# Altium schematic symbol library microbuilder.SCHLIB: 530 symbols (part 4 of 7) (continued)
## LPC1113/4 (continued)
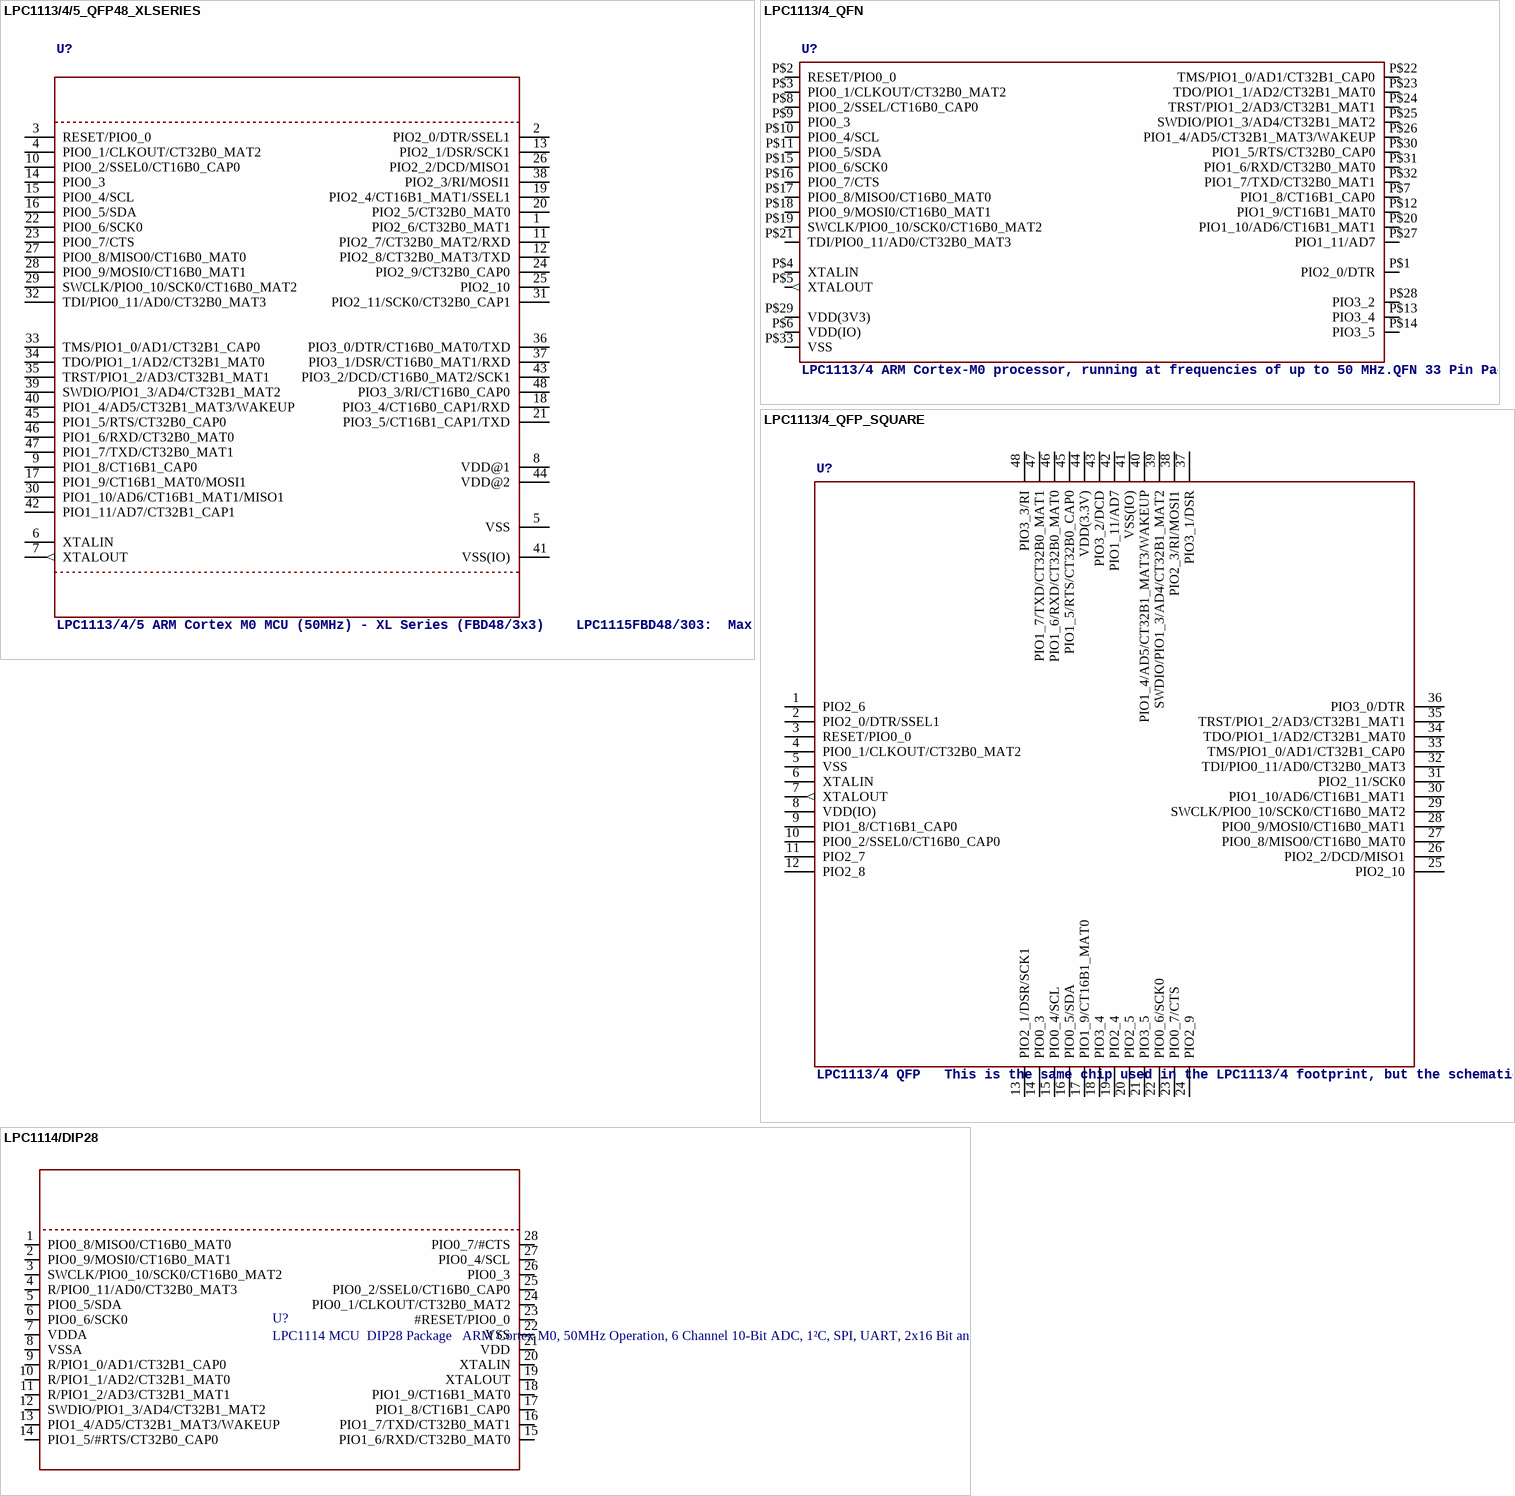
[diagram p29: symbols LPC1113/4/5_QFP48_XLSERIES to LPC1114/DIP28]

## LPC1113/4/5_QFP48_XLSERIES
designator U?, comment LPC1113/4/5 ARM Cortex M0 MCU (50MHz) - XL Series (FBD48/3x3)    LPC1115FBD48/303:  Max Frequency: 50MHz  Flash: 64kB  SRAM: 8kB  ADC: 10-bit
footprint LQFP48
pins: 1 PIO2_6/CT32B0_MAT1, 2 PIO2_0/DTR/SSEL1, 3 RESET/PIO0_0, 4 PIO0_1/CLKOUT/CT32B0_MAT2, 5 VSS (power), 6 XTALIN, 7 XTALOUT (out), 8 VDD@1 (power), 9 PIO1_8/CT16B1_CAP0, 10 PIO0_2/SSEL0/CT16B0_CAP0, 11 PIO2_7/CT32B0_MAT2/RXD, 12 PIO2_8/CT32B0_MAT3/TXD, 13 PIO2_1/DSR/SCK1, 14 PIO0_3, 15 PIO0_4/SCL, 16 PIO0_5/SDA, 17 PIO1_9/CT16B1_MAT0/MOSI1, 18 PIO3_4/CT16B0_CAP1/RXD, 19 PIO2_4/CT16B1_MAT1/SSEL1, 20 PIO2_5/CT32B0_MAT0, 21 PIO3_5/CT16B1_CAP1/TXD, 22 PIO0_6/SCK0, 23 PIO0_7/CTS, 24 PIO2_9/CT32B0_CAP0, 25 PIO2_10, 26 PIO2_2/DCD/MISO1, 27 PIO0_8/MISO0/CT16B0_MAT0, 28 PIO0_9/MOSI0/CT16B0_MAT1, 29 SWCLK/PIO0_10/SCK0/CT16B0_MAT2, 30 PIO1_10/AD6/CT16B1_MAT1/MISO1, 31 PIO2_11/SCK0/CT32B0_CAP1, 32 TDI/PIO0_11/AD0/CT32B0_MAT3, 33 TMS/PIO1_0/AD1/CT32B1_CAP0, 34 TDO/PIO1_1/AD2/CT32B1_MAT0, 35 TRST/PIO1_2/AD3/CT32B1_MAT1, 36 PIO3_0/DTR/CT16B0_MAT0/TXD, 37 PIO3_1/DSR/CT16B0_MAT1/RXD, 38 PIO2_3/RI/MOSI1, 39 SWDIO/PIO1_3/AD4/CT32B1_MAT2, 40 PIO1_4/AD5/CT32B1_MAT3/WAKEUP, 41 VSS(IO) (power), 42 PIO1_11/AD7/CT32B1_CAP1, 43 PIO3_2/DCD/CT16B0_MAT2/SCK1, 44 VDD@2 (power), 45 PIO1_5/RTS/CT32B0_CAP0, 46 PIO1_6/RXD/CT32B0_MAT0, 47 PIO1_7/TXD/CT32B0_MAT1, 48 PIO3_3/RI/CT16B0_CAP0

## LPC1113/4_QFN
designator U?, comment LPC1113/4 ARM Cortex-M0 processor, running at frequencies of up to 50 MHz.QFN 33 Pin Package
MANF: NXP; MANF#: LPC1114FHN33/301,5; DIGIKEY#: 568-4948-ND
footprint HVQFN33-7X7
pins: P$1 PIO2_0/DTR, P$2 RESET/PIO0_0, P$3 PIO0_1/CLKOUT/CT32B0_MAT2, P$4 XTALIN, P$5 XTALOUT (out), P$6 VDD(IO) (power), P$7 PIO1_8/CT16B1_CAP0, P$8 PIO0_2/SSEL/CT16B0_CAP0, P$9 PIO0_3, P$10 PIO0_4/SCL, P$11 PIO0_5/SDA, P$12 PIO1_9/CT16B1_MAT0, P$13 PIO3_4, P$14 PIO3_5, P$15 PIO0_6/SCK0, P$16 PIO0_7/CTS, P$17 PIO0_8/MISO0/CT16B0_MAT0, P$18 PIO0_9/MOSI0/CT16B0_MAT1, P$19 SWCLK/PIO0_10/SCK0/CT16B0_MAT2, P$20 PIO1_10/AD6/CT16B1_MAT1, P$21 TDI/PIO0_11/AD0/CT32B0_MAT3, P$22 TMS/PIO1_0/AD1/CT32B1_CAP0, P$23 TDO/PIO1_1/AD2/CT32B1_MAT0, P$24 TRST/PIO1_2/AD3/CT32B1_MAT1, P$25 SWDIO/PIO1_3/AD4/CT32B1_MAT2, P$26 PIO1_4/AD5/CT32B1_MAT3/WAKEUP, P$27 PIO1_11/AD7, P$28 PIO3_2, P$29 VDD(3V3) (power), P$30 PIO1_5/RTS/CT32B0_CAP0, P$31 PIO1_6/RXD/CT32B0_MAT0, P$32 PIO1_7/TXD/CT32B0_MAT1, P$33 VSS (power)

## LPC1113/4_QFP_SQUARE
designator U?, comment LPC1113/4 QFP   This is the same chip used in the LPC1113/4 footprint, but the schematic symbol is a square corresponding to the same pinout used on the LQFP48 IC.  This alternate layout can be useful when designing space-constrained devices, and to minimise the number of vias on a board.
footprint LQFP48
pins: 1 PIO2_6, 2 PIO2_0/DTR/SSEL1, 3 RESET/PIO0_0, 4 PIO0_1/CLKOUT/CT32B0_MAT2, 5 VSS (power), 6 XTALIN, 7 XTALOUT (out), 8 VDD(IO) (power), 9 PIO1_8/CT16B1_CAP0, 10 PIO0_2/SSEL0/CT16B0_CAP0, 11 PIO2_7, 12 PIO2_8, 13 PIO2_1/DSR/SCK1, 14 PIO0_3, 15 PIO0_4/SCL, 16 PIO0_5/SDA, 17 PIO1_9/CT16B1_MAT0, 18 PIO3_4, 19 PIO2_4, 20 PIO2_5, 21 PIO3_5, 22 PIO0_6/SCK0, 23 PIO0_7/CTS, 24 PIO2_9, 25 PIO2_10, 26 PIO2_2/DCD/MISO1, 27 PIO0_8/MISO0/CT16B0_MAT0, 28 PIO0_9/MOSI0/CT16B0_MAT1, 29 SWCLK/PIO0_10/SCK0/CT16B0_MAT2, 30 PIO1_10/AD6/CT16B1_MAT1, 31 PIO2_11/SCK0, 32 TDI/PIO0_11/AD0/CT32B0_MAT3, 33 TMS/PIO1_0/AD1/CT32B1_CAP0, 34 TDO/PIO1_1/AD2/CT32B1_MAT0, 35 TRST/PIO1_2/AD3/CT32B1_MAT1, 36 PIO3_0/DTR, 37 PIO3_1/DSR, 38 PIO2_3/RI/MOSI1, 39 SWDIO/PIO1_3/AD4/CT32B1_MAT2, 40 PIO1_4/AD5/CT32B1_MAT3/WAKEUP, 41 VSS(IO) (power), 42 PIO1_11/AD7, 43 PIO3_2/DCD, 44 VDD(3.3V) (power), 45 PIO1_5/RTS/CT32B0_CAP0, 46 PIO1_6/RXD/CT32B0_MAT0, 47 PIO1_7/TXD/CT32B0_MAT1, 48 PIO3_3/RI

## LPC1114/DIP28
designator U?, comment LPC1114 MCU  DIP28 Package   ARM Cortex M0, 50MHz Operation, 6 Channel 10-Bit ADC, 1²C, SPI, UART, 2x16 Bit and 2x32 Bit Timers, Internal 12MHz Oscillator, 1.8-3.6V operation.
footprint DIL28_600MIL
pins: 1 PIO0_8/MISO0/CT16B0_MAT0, 2 PIO0_9/MOSI0/CT16B0_MAT1, 3 SWCLK/PIO0_10/SCK0/CT16B0_MAT2, 4 R/PIO0_11/AD0/CT32B0_MAT3, 5 PIO0_5/SDA, 6 PIO0_6/SCK0, 7 VDDA, 8 VSSA, 9 R/PIO1_0/AD1/CT32B1_CAP0, 10 R/PIO1_1/AD2/CT32B1_MAT0, 11 R/PIO1_2/AD3/CT32B1_MAT1, 12 SWDIO/PIO1_3/AD4/CT32B1_MAT2, 13 PIO1_4/AD5/CT32B1_MAT3/WAKEUP, 14 PIO1_5/#RTS/CT32B0_CAP0, 15 PIO1_6/RXD/CT32B0_MAT0, 16 PIO1_7/TXD/CT32B0_MAT1, 17 PIO1_8/CT16B1_CAP0, 18 PIO1_9/CT16B1_MAT0, 19 XTALOUT, 20 XTALIN, 21 VDD, 22 VSS, 23 #RESET/PIO0_0, 24 PIO0_1/CLKOUT/CT32B0_MAT2, 25 PIO0_2/SSEL0/CT16B0_CAP0, 26 PIO0_3, 27 PIO0_4/SCL, 28 PIO0_7/#CTS

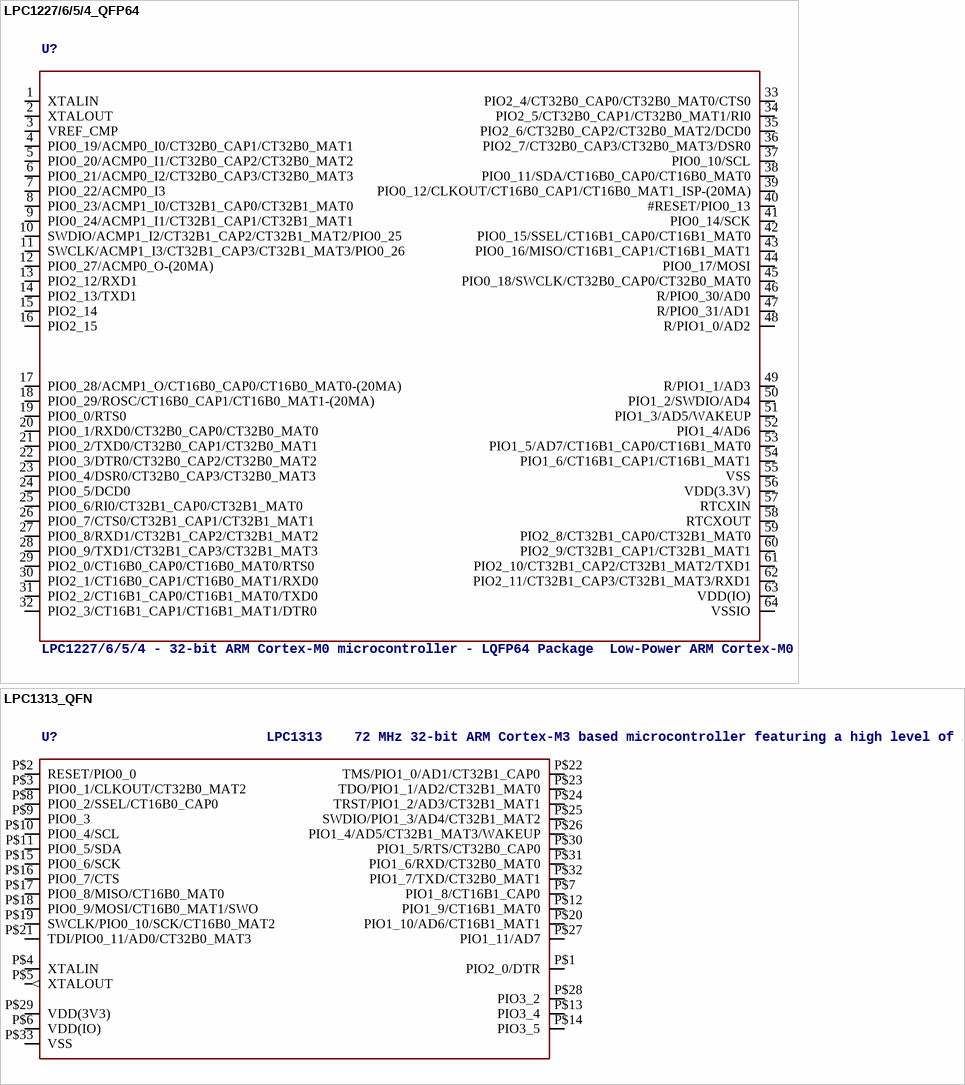
[diagram p30: symbols LPC1227/6/5/4_QFP64 to LPC1313_QFN]

## LPC1227/6/5/4_QFP64
designator U?, comment LPC1227/6/5/4 - 32-bit ARM Cortex-M0 microcontroller - LQFP64 Package  Low-Power ARM Cortex-M0 up to 33MHz  Up to 8KB SRAM / 128KB Flash  Digital Peripherals: Micro DMA Controller, CRC  Engine, 2xUART, SSP/SPI, I2C, 2x 32-bit Timers, 2x16-bit Timers  Analog Periherals: 8-Channel 10-bit ADC, 2 Analog Comparators
footprint LQFP64
pins: 1 XTALIN, 2 XTALOUT, 3 VREF_CMP, 4 PIO0_19/ACMP0_I0/CT32B0_CAP1/CT32B0_MAT1, 5 PIO0_20/ACMP0_I1/CT32B0_CAP2/CT32B0_MAT2, 6 PIO0_21/ACMP0_I2/CT32B0_CAP3/CT32B0_MAT3, 7 PIO0_22/ACMP0_I3, 8 PIO0_23/ACMP1_I0/CT32B1_CAP0/CT32B1_MAT0, 9 PIO0_24/ACMP1_I1/CT32B1_CAP1/CT32B1_MAT1, 10 SWDIO/ACMP1_I2/CT32B1_CAP2/CT32B1_MAT2/PIO0_25, 11 SWCLK/ACMP1_I3/CT32B1_CAP3/CT32B1_MAT3/PIO0_26, 12 PIO0_27/ACMP0_O-(20MA), 13 PIO2_12/RXD1, 14 PIO2_13/TXD1, 15 PIO2_14, 16 PIO2_15, 17 PIO0_28/ACMP1_O/CT16B0_CAP0/CT16B0_MAT0-(20MA), 18 PIO0_29/ROSC/CT16B0_CAP1/CT16B0_MAT1-(20MA), 19 PIO0_0/RTS0, 20 PIO0_1/RXD0/CT32B0_CAP0/CT32B0_MAT0, 21 PIO0_2/TXD0/CT32B0_CAP1/CT32B0_MAT1, 22 PIO0_3/DTR0/CT32B0_CAP2/CT32B0_MAT2, 23 PIO0_4/DSR0/CT32B0_CAP3/CT32B0_MAT3, 24 PIO0_5/DCD0, 25 PIO0_6/RI0/CT32B1_CAP0/CT32B1_MAT0, 26 PIO0_7/CTS0/CT32B1_CAP1/CT32B1_MAT1, 27 PIO0_8/RXD1/CT32B1_CAP2/CT32B1_MAT2, 28 PIO0_9/TXD1/CT32B1_CAP3/CT32B1_MAT3, 29 PIO2_0/CT16B0_CAP0/CT16B0_MAT0/RTS0, 30 PIO2_1/CT16B0_CAP1/CT16B0_MAT1/RXD0, 31 PIO2_2/CT16B1_CAP0/CT16B1_MAT0/TXD0, 32 PIO2_3/CT16B1_CAP1/CT16B1_MAT1/DTR0, 33 PIO2_4/CT32B0_CAP0/CT32B0_MAT0/CTS0, 34 PIO2_5/CT32B0_CAP1/CT32B0_MAT1/RI0, 35 PIO2_6/CT32B0_CAP2/CT32B0_MAT2/DCD0, 36 PIO2_7/CT32B0_CAP3/CT32B0_MAT3/DSR0, 37 PIO0_10/SCL, 38 PIO0_11/SDA/CT16B0_CAP0/CT16B0_MAT0, 39 PIO0_12/CLKOUT/CT16B0_CAP1/CT16B0_MAT1_ISP-(20MA), 40 #RESET/PIO0_13, 41 PIO0_14/SCK, 42 PIO0_15/SSEL/CT16B1_CAP0/CT16B1_MAT0, 43 PIO0_16/MISO/CT16B1_CAP1/CT16B1_MAT1, 44 PIO0_17/MOSI, 45 PIO0_18/SWCLK/CT32B0_CAP0/CT32B0_MAT0, 46 R/PIO0_30/AD0, 47 R/PIO0_31/AD1, 48 R/PIO1_0/AD2, 49 R/PIO1_1/AD3, 50 PIO1_2/SWDIO/AD4, 51 PIO1_3/AD5/WAKEUP, 52 PIO1_4/AD6, 53 PIO1_5/AD7/CT16B1_CAP0/CT16B1_MAT0, 54 PIO1_6/CT16B1_CAP1/CT16B1_MAT1, 55 VSS, 56 VDD(3.3V), 57 RTCXIN, 58 RTCXOUT, 59 PIO2_8/CT32B1_CAP0/CT32B1_MAT0, 60 PIO2_9/CT32B1_CAP1/CT32B1_MAT1, 61 PIO2_10/CT32B1_CAP2/CT32B1_MAT2/TXD1, 62 PIO2_11/CT32B1_CAP3/CT32B1_MAT3/RXD1, 63 VDD(IO), 64 VSSIO

## LPC1313_QFN
designator U?, comment LPC1313    72 MHz 32-bit ARM Cortex-M3 based microcontroller featuring a high level of integration and low power consumption. 32 kB Flash, 8 kB SRAM MarcVl - Datasheet available on www.nxp.com   Digikey: 568-4913-ND
footprint HVQFN33-7X7
pins: P$1 PIO2_0/DTR, P$2 RESET/PIO0_0, P$3 PIO0_1/CLKOUT/CT32B0_MAT2, P$4 XTALIN, P$5 XTALOUT (out), P$6 VDD(IO) (power), P$7 PIO1_8/CT16B1_CAP0, P$8 PIO0_2/SSEL/CT16B0_CAP0, P$9 PIO0_3, P$10 PIO0_4/SCL, P$11 PIO0_5/SDA, P$12 PIO1_9/CT16B1_MAT0, P$13 PIO3_4, P$14 PIO3_5, P$15 PIO0_6/SCK, P$16 PIO0_7/CTS, P$17 PIO0_8/MISO/CT16B0_MAT0, P$18 PIO0_9/MOSI/CT16B0_MAT1/SWO, P$19 SWCLK/PIO0_10/SCK/CT16B0_MAT2, P$20 PIO1_10/AD6/CT16B1_MAT1, P$21 TDI/PIO0_11/AD0/CT32B0_MAT3, P$22 TMS/PIO1_0/AD1/CT32B1_CAP0, P$23 TDO/PIO1_1/AD2/CT32B1_MAT0, P$24 TRST/PIO1_2/AD3/CT32B1_MAT1, P$25 SWDIO/PIO1_3/AD4/CT32B1_MAT2, P$26 PIO1_4/AD5/CT32B1_MAT3/WAKEUP, P$27 PIO1_11/AD7, P$28 PIO3_2, P$29 VDD(3V3) (power), P$30 PIO1_5/RTS/CT32B0_CAP0, P$31 PIO1_6/RXD/CT32B0_MAT0, P$32 PIO1_7/TXD/CT32B0_MAT1, P$33 VSS (power)

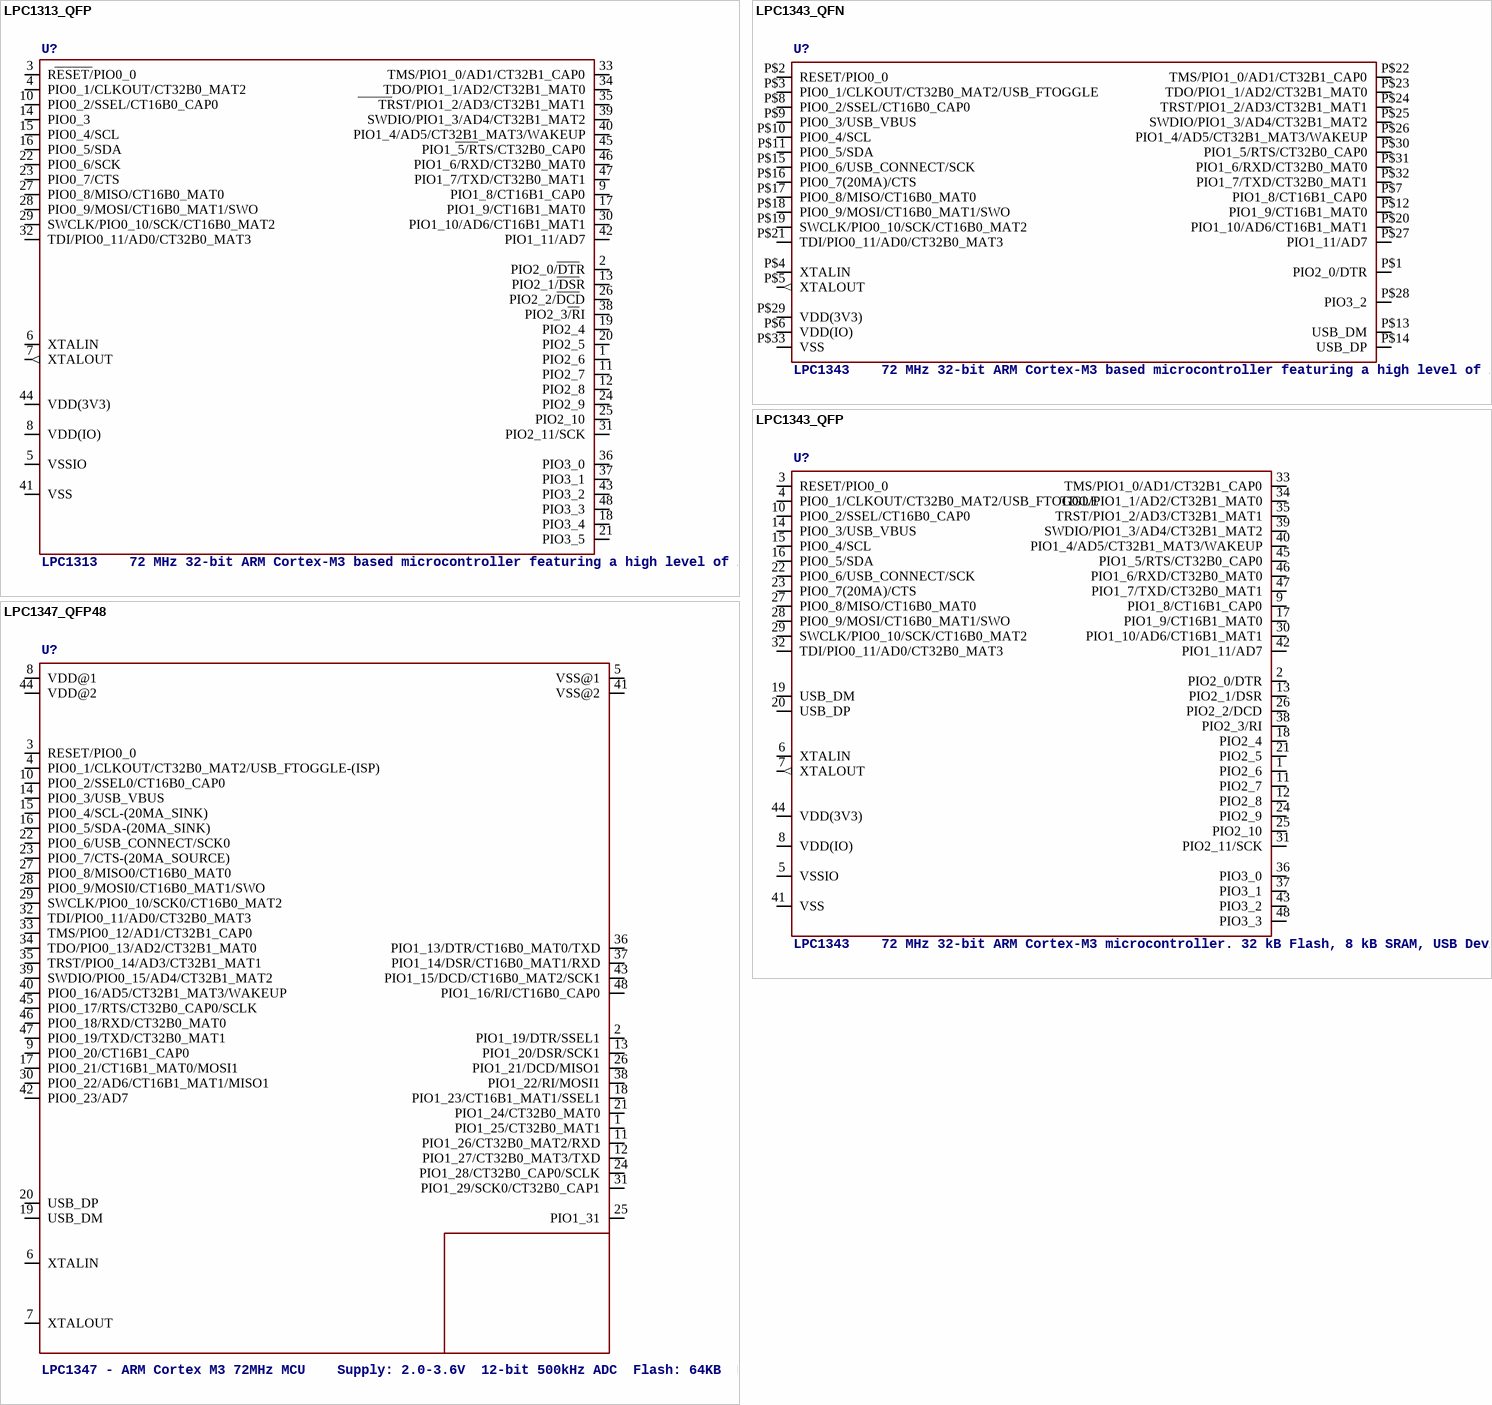
[diagram p31: symbols LPC1313_QFP to LPC1347_QFP48]

## LPC1313_QFP
designator U?, comment LPC1313    72 MHz 32-bit ARM Cortex-M3 based microcontroller featuring a high level of integration and low power consumption. 32 kB Flash, 8 kB SRAM MarcVl - Datasheet available on www.nxp.com   Digikey: 568-4914-ND
footprint LQFP48
pins: 1 PIO2_6, 2 PIO2_0/DTR, 3 RESET/PIO0_0, 4 PIO0_1/CLKOUT/CT32B0_MAT2, 5 VSSIO (power), 6 XTALIN, 7 XTALOUT (out), 8 VDD(IO) (power), 9 PIO1_8/CT16B1_CAP0, 10 PIO0_2/SSEL/CT16B0_CAP0, 11 PIO2_7, 12 PIO2_8, 13 PIO2_1/DSR, 14 PIO0_3, 15 PIO0_4/SCL, 16 PIO0_5/SDA, 17 PIO1_9/CT16B1_MAT0, 18 PIO3_4, 19 PIO2_4, 20 PIO2_5, 21 PIO3_5, 22 PIO0_6/SCK, 23 PIO0_7/CTS, 24 PIO2_9, 25 PIO2_10, 26 PIO2_2/DCD, 27 PIO0_8/MISO/CT16B0_MAT0, 28 PIO0_9/MOSI/CT16B0_MAT1/SWO, 29 SWCLK/PIO0_10/SCK/CT16B0_MAT2, 30 PIO1_10/AD6/CT16B1_MAT1, 31 PIO2_11/SCK, 32 TDI/PIO0_11/AD0/CT32B0_MAT3, 33 TMS/PIO1_0/AD1/CT32B1_CAP0, 34 TDO/PIO1_1/AD2/CT32B1_MAT0, 35 TRST/PIO1_2/AD3/CT32B1_MAT1, 36 PIO3_0, 37 PIO3_1, 38 PIO2_3/RI, 39 SWDIO/PIO1_3/AD4/CT32B1_MAT2, 40 PIO1_4/AD5/CT32B1_MAT3/WAKEUP, 41 VSS (power), 42 PIO1_11/AD7, 43 PIO3_2, 44 VDD(3V3) (power), 45 PIO1_5/RTS/CT32B0_CAP0, 46 PIO1_6/RXD/CT32B0_MAT0, 47 PIO1_7/TXD/CT32B0_MAT1, 48 PIO3_3

## LPC1343_QFN
designator U?, comment LPC1343    72 MHz 32-bit ARM Cortex-M3 based microcontroller featuring a high level of integration and low power consumption. 32 kB Flash, 8 kB SRAM, USB Device MarcVl - Datasheet available on www.nxp.com
MANF: NXP; MANF#: LPC1343FHN33,551; DIGIKEY#: 568-4944-ND
footprint HVQFN33-7X7
pins: P$1 PIO2_0/DTR, P$2 RESET/PIO0_0, P$3 PIO0_1/CLKOUT/CT32B0_MAT2/USB_FTOGGLE, P$4 XTALIN, P$5 XTALOUT (out), P$6 VDD(IO) (power), P$7 PIO1_8/CT16B1_CAP0, P$8 PIO0_2/SSEL/CT16B0_CAP0, P$9 PIO0_3/USB_VBUS, P$10 PIO0_4/SCL, P$11 PIO0_5/SDA, P$12 PIO1_9/CT16B1_MAT0, P$13 USB_DM, P$14 USB_DP, P$15 PIO0_6/USB_CONNECT/SCK, P$16 PIO0_7(20MA)/CTS, P$17 PIO0_8/MISO/CT16B0_MAT0, P$18 PIO0_9/MOSI/CT16B0_MAT1/SWO, P$19 SWCLK/PIO0_10/SCK/CT16B0_MAT2, P$20 PIO1_10/AD6/CT16B1_MAT1, P$21 TDI/PIO0_11/AD0/CT32B0_MAT3, P$22 TMS/PIO1_0/AD1/CT32B1_CAP0, P$23 TDO/PIO1_1/AD2/CT32B1_MAT0, P$24 TRST/PIO1_2/AD3/CT32B1_MAT1, P$25 SWDIO/PIO1_3/AD4/CT32B1_MAT2, P$26 PIO1_4/AD5/CT32B1_MAT3/WAKEUP, P$27 PIO1_11/AD7, P$28 PIO3_2, P$29 VDD(3V3) (power), P$30 PIO1_5/RTS/CT32B0_CAP0, P$31 PIO1_6/RXD/CT32B0_MAT0, P$32 PIO1_7/TXD/CT32B0_MAT1, P$33 VSS (power)

## LPC1343_QFP
designator U?, comment LPC1343    72 MHz 32-bit ARM Cortex-M3 microcontroller. 32 kB Flash, 8 kB SRAM, USB Device    Mouser: 771-LPC1343FBD48151  Digikey: 568-4945-ND
MANF: NXP; MANF#: LPC1343FBD48,151; DIGIKEY#: 568-4945-ND
footprint LQFP48
pins: 1 PIO2_6, 2 PIO2_0/DTR, 3 RESET/PIO0_0, 4 PIO0_1/CLKOUT/CT32B0_MAT2/USB_FTOGGLE, 5 VSSIO (power), 6 XTALIN, 7 XTALOUT (out), 8 VDD(IO) (power), 9 PIO1_8/CT16B1_CAP0, 10 PIO0_2/SSEL/CT16B0_CAP0, 11 PIO2_7, 12 PIO2_8, 13 PIO2_1/DSR, 14 PIO0_3/USB_VBUS, 15 PIO0_4/SCL, 16 PIO0_5/SDA, 17 PIO1_9/CT16B1_MAT0, 18 PIO2_4, 19 USB_DM, 20 USB_DP, 21 PIO2_5, 22 PIO0_6/USB_CONNECT/SCK, 23 PIO0_7(20MA)/CTS, 24 PIO2_9, 25 PIO2_10, 26 PIO2_2/DCD, 27 PIO0_8/MISO/CT16B0_MAT0, 28 PIO0_9/MOSI/CT16B0_MAT1/SWO, 29 SWCLK/PIO0_10/SCK/CT16B0_MAT2, 30 PIO1_10/AD6/CT16B1_MAT1, 31 PIO2_11/SCK, 32 TDI/PIO0_11/AD0/CT32B0_MAT3, 33 TMS/PIO1_0/AD1/CT32B1_CAP0, 34 TDO/PIO1_1/AD2/CT32B1_MAT0, 35 TRST/PIO1_2/AD3/CT32B1_MAT1, 36 PIO3_0, 37 PIO3_1, 38 PIO2_3/RI, 39 SWDIO/PIO1_3/AD4/CT32B1_MAT2, 40 PIO1_4/AD5/CT32B1_MAT3/WAKEUP, 41 VSS (power), 42 PIO1_11/AD7, 43 PIO3_2, 44 VDD(3V3) (power), 45 PIO1_5/RTS/CT32B0_CAP0, 46 PIO1_6/RXD/CT32B0_MAT0, 47 PIO1_7/TXD/CT32B0_MAT1, 48 PIO3_3

## LPC1347_QFP48
designator U?, comment LPC1347 - ARM Cortex M3 72MHz MCU    Supply: 2.0-3.6V  12-bit 500kHz ADC  Flash: 64KB  EEPROM: 4KB  SRAM: 8KB SRAM0 + 2KB SRAM1 + 2KB USB  Temp: -40°C - 85°C
footprint LQFP48
pins: 1 PIO1_25/CT32B0_MAT1, 2 PIO1_19/DTR/SSEL1, 3 RESET/PIO0_0, 4 PIO0_1/CLKOUT/CT32B0_MAT2/USB_FTOGGLE-(ISP), 5 VSS@1 (power), 6 XTALIN, 7 XTALOUT, 8 VDD@1 (power), 9 PIO0_20/CT16B1_CAP0, 10 PIO0_2/SSEL0/CT16B0_CAP0, 11 PIO1_26/CT32B0_MAT2/RXD, 12 PIO1_27/CT32B0_MAT3/TXD, 13 PIO1_20/DSR/SCK1, 14 PIO0_3/USB_VBUS, 15 PIO0_4/SCL-(20MA_SINK), 16 PIO0_5/SDA-(20MA_SINK), 17 PIO0_21/CT16B1_MAT0/MOSI1, 18 PIO1_23/CT16B1_MAT1/SSEL1, 19 USB_DM, 20 USB_DP, 21 PIO1_24/CT32B0_MAT0, 22 PIO0_6/USB_CONNECT/SCK0, 23 PIO0_7/CTS-(20MA_SOURCE), 24 PIO1_28/CT32B0_CAP0/SCLK, 25 PIO1_31, 26 PIO1_21/DCD/MISO1, 27 PIO0_8/MISO0/CT16B0_MAT0, 28 PIO0_9/MOSI0/CT16B0_MAT1/SWO, 29 SWCLK/PIO0_10/SCK0/CT16B0_MAT2, 30 PIO0_22/AD6/CT16B1_MAT1/MISO1, 31 PIO1_29/SCK0/CT32B0_CAP1, 32 TDI/PIO0_11/AD0/CT32B0_MAT3, 33 TMS/PIO0_12/AD1/CT32B1_CAP0, 34 TDO/PIO0_13/AD2/CT32B1_MAT0, 35 TRST/PIO0_14/AD3/CT32B1_MAT1, 36 PIO1_13/DTR/CT16B0_MAT0/TXD, 37 PIO1_14/DSR/CT16B0_MAT1/RXD, 38 PIO1_22/RI/MOSI1, 39 SWDIO/PIO0_15/AD4/CT32B1_MAT2, 40 PIO0_16/AD5/CT32B1_MAT3/WAKEUP, 41 VSS@2 (power), 42 PIO0_23/AD7, 43 PIO1_15/DCD/CT16B0_MAT2/SCK1, 44 VDD@2 (power), 45 PIO0_17/RTS/CT32B0_CAP0/SCLK, 46 PIO0_18/RXD/CT32B0_MAT0, 47 PIO0_19/TXD/CT32B0_MAT1, 48 PIO1_16/RI/CT16B0_CAP0

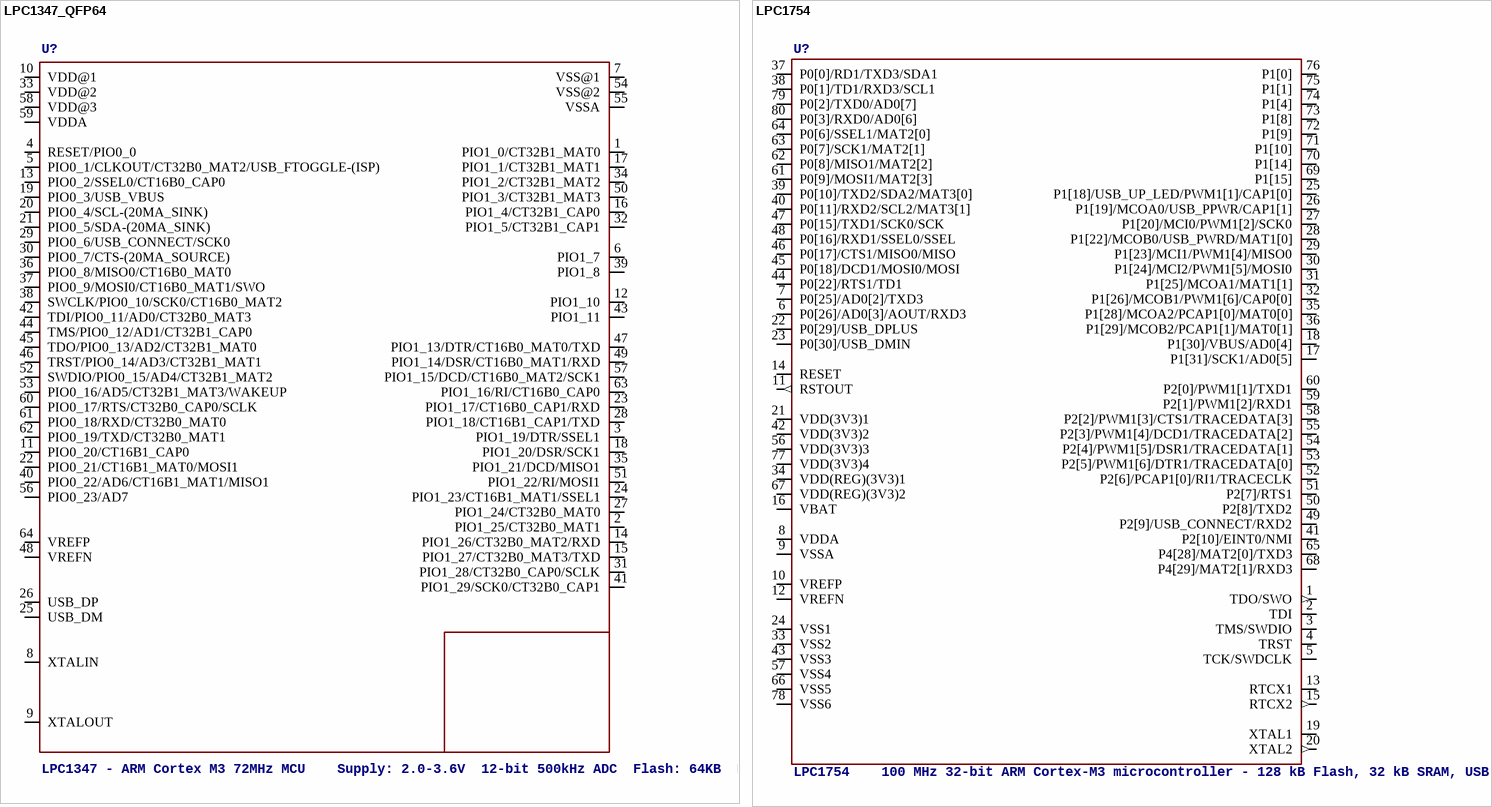
[diagram p32: symbols LPC1347_QFP64 to LPC1754]

## LPC1347_QFP64
designator U?, comment LPC1347 - ARM Cortex M3 72MHz MCU    Supply: 2.0-3.6V  12-bit 500kHz ADC  Flash: 64KB  EEPROM: 4KB  SRAM: 8KB SRAM0 + 2KB SRAM1 + 2KB USB  Temp: -40°C - 85°C
footprint LQFP64
pins: 1 PIO1_0/CT32B1_MAT0, 2 PIO1_25/CT32B0_MAT1, 3 PIO1_19/DTR/SSEL1, 4 RESET/PIO0_0, 5 PIO0_1/CLKOUT/CT32B0_MAT2/USB_FTOGGLE-(ISP), 6 PIO1_7, 7 VSS@1 (power), 8 XTALIN, 9 XTALOUT, 10 VDD@1 (power), 11 PIO0_20/CT16B1_CAP0, 12 PIO1_10, 13 PIO0_2/SSEL0/CT16B0_CAP0, 14 PIO1_26/CT32B0_MAT2/RXD, 15 PIO1_27/CT32B0_MAT3/TXD, 16 PIO1_4/CT32B1_CAP0, 17 PIO1_1/CT32B1_MAT1, 18 PIO1_20/DSR/SCK1, 19 PIO0_3/USB_VBUS, 20 PIO0_4/SCL-(20MA_SINK), 21 PIO0_5/SDA-(20MA_SINK), 22 PIO0_21/CT16B1_MAT0/MOSI1, 23 PIO1_17/CT16B0_CAP1/RXD, 24 PIO1_23/CT16B1_MAT1/SSEL1, 25 USB_DM, 26 USB_DP, 27 PIO1_24/CT32B0_MAT0, 28 PIO1_18/CT16B1_CAP1/TXD, 29 PIO0_6/USB_CONNECT/SCK0, 30 PIO0_7/CTS-(20MA_SOURCE), 31 PIO1_28/CT32B0_CAP0/SCLK, 32 PIO1_5/CT32B1_CAP1, 33 VDD@2 (power), 34 PIO1_2/CT32B1_MAT2, 35 PIO1_21/DCD/MISO1, 36 PIO0_8/MISO0/CT16B0_MAT0, 37 PIO0_9/MOSI0/CT16B0_MAT1/SWO, 38 SWCLK/PIO0_10/SCK0/CT16B0_MAT2, 39 PIO1_8, 40 PIO0_22/AD6/CT16B1_MAT1/MISO1, 41 PIO1_29/SCK0/CT32B0_CAP1, 42 TDI/PIO0_11/AD0/CT32B0_MAT3, 43 PIO1_11, 44 TMS/PIO0_12/AD1/CT32B1_CAP0, 45 TDO/PIO0_13/AD2/CT32B1_MAT0, 46 TRST/PIO0_14/AD3/CT32B1_MAT1, 47 PIO1_13/DTR/CT16B0_MAT0/TXD, 48 VREFN, 49 PIO1_14/DSR/CT16B0_MAT1/RXD, 50 PIO1_3/CT32B1_MAT3, 51 PIO1_22/RI/MOSI1, 52 SWDIO/PIO0_15/AD4/CT32B1_MAT2, 53 PIO0_16/AD5/CT32B1_MAT3/WAKEUP, 54 VSS@2 (power), 55 VSSA (power), 56 PIO0_23/AD7, 57 PIO1_15/DCD/CT16B0_MAT2/SCK1, 58 VDD@3 (power), 59 VDDA (power), 60 PIO0_17/RTS/CT32B0_CAP0/SCLK, 61 PIO0_18/RXD/CT32B0_MAT0, 62 PIO0_19/TXD/CT32B0_MAT1, 63 PIO1_16/RI/CT16B0_CAP0, 64 VREFP

## LPC1754
designator U?, comment LPC1754    100 MHz 32-bit ARM Cortex-M3 microcontroller - 128 kB Flash, 32 kB SRAM, USB Device/Host/OTG, CAN, DAC, RTC    Digikey: 568-4790-ND
footprint LQFP80
pins: 1 TDO/SWO (out), 2 TDI, 3 TMS/SWDIO, 4 TRST, 5 TCK/SWDCLK, 6 P0[26]/AD0[3]/AOUT/RXD3, 7 P0[25]/AD0[2]/TXD3, 8 VDDA (power), 9 VSSA (power), 10 VREFP, 11 RSTOUT (out), 12 VREFN, 13 RTCX1, 14 RESET, 15 RTCX2 (out), 16 VBAT (power), 17 P1[31]/SCK1/AD0[5], 18 P1[30]/VBUS/AD0[4], 19 XTAL1, 20 XTAL2 (out), 21 VDD(3V3)1 (power), 22 P0[29]/USB_DPLUS, 23 P0[30]/USB_DMIN, 24 VSS1 (power), 25 P1[18]/USB_UP_LED/PWM1[1]/CAP1[0], 26 P1[19]/MCOA0/USB_PPWR/CAP1[1], 27 P1[20]/MCI0/PWM1[2]/SCK0, 28 P1[22]/MCOB0/USB_PWRD/MAT1[0], 29 P1[23]/MCI1/PWM1[4]/MISO0, 30 P1[24]/MCI2/PWM1[5]/MOSI0, 31 P1[25]/MCOA1/MAT1[1], 32 P1[26]/MCOB1/PWM1[6]/CAP0[0], 33 VSS2 (power), 34 VDD(REG)(3V3)1 (power), 35 P1[28]/MCOA2/PCAP1[0]/MAT0[0], 36 P1[29]/MCOB2/PCAP1[1]/MAT0[1], 37 P0[0]/RD1/TXD3/SDA1, 38 P0[1]/TD1/RXD3/SCL1, 39 P0[10]/TXD2/SDA2/MAT3[0], 40 P0[11]/RXD2/SCL2/MAT3[1], 41 P2[10]/EINT0/NMI, 42 VDD(3V3)2 (power), 43 VSS3 (power), 44 P0[22]/RTS1/TD1, 45 P0[18]/DCD1/MOSI0/MOSI, 46 P0[17]/CTS1/MISO0/MISO, 47 P0[15]/TXD1/SCK0/SCK, 48 P0[16]/RXD1/SSEL0/SSEL, 49 P2[9]/USB_CONNECT/RXD2, 50 P2[8]/TXD2, 51 P2[7]/RTS1, 52 P2[6]/PCAP1[0]/RI1/TRACECLK, 53 P2[5]/PWM1[6]/DTR1/TRACEDATA[0], 54 P2[4]/PWM1[5]/DSR1/TRACEDATA[1], 55 P2[3]/PWM1[4]/DCD1/TRACEDATA[2], 56 VDD(3V3)3 (power), 57 VSS4 (power), 58 P2[2]/PWM1[3]/CTS1/TRACEDATA[3], 59 P2[1]/PWM1[2]/RXD1, 60 P2[0]/PWM1[1]/TXD1, 61 P0[9]/MOSI1/MAT2[3], 62 P0[8]/MISO1/MAT2[2], 63 P0[7]/SCK1/MAT2[1], 64 P0[6]/SSEL1/MAT2[0], 65 P4[28]/MAT2[0]/TXD3, 66 VSS5 (power), 67 VDD(REG)(3V3)2 (power), 68 P4[29]/MAT2[1]/RXD3, 69 P1[15], 70 P1[14], 71 P1[10], 72 P1[9], 73 P1[8], 74 P1[4], 75 P1[1], 76 P1[0], 77 VDD(3V3)4 (power), 78 VSS6 (power), 79 P0[2]/TXD0/AD0[7], 80 P0[3]/RXD0/AD0[6]

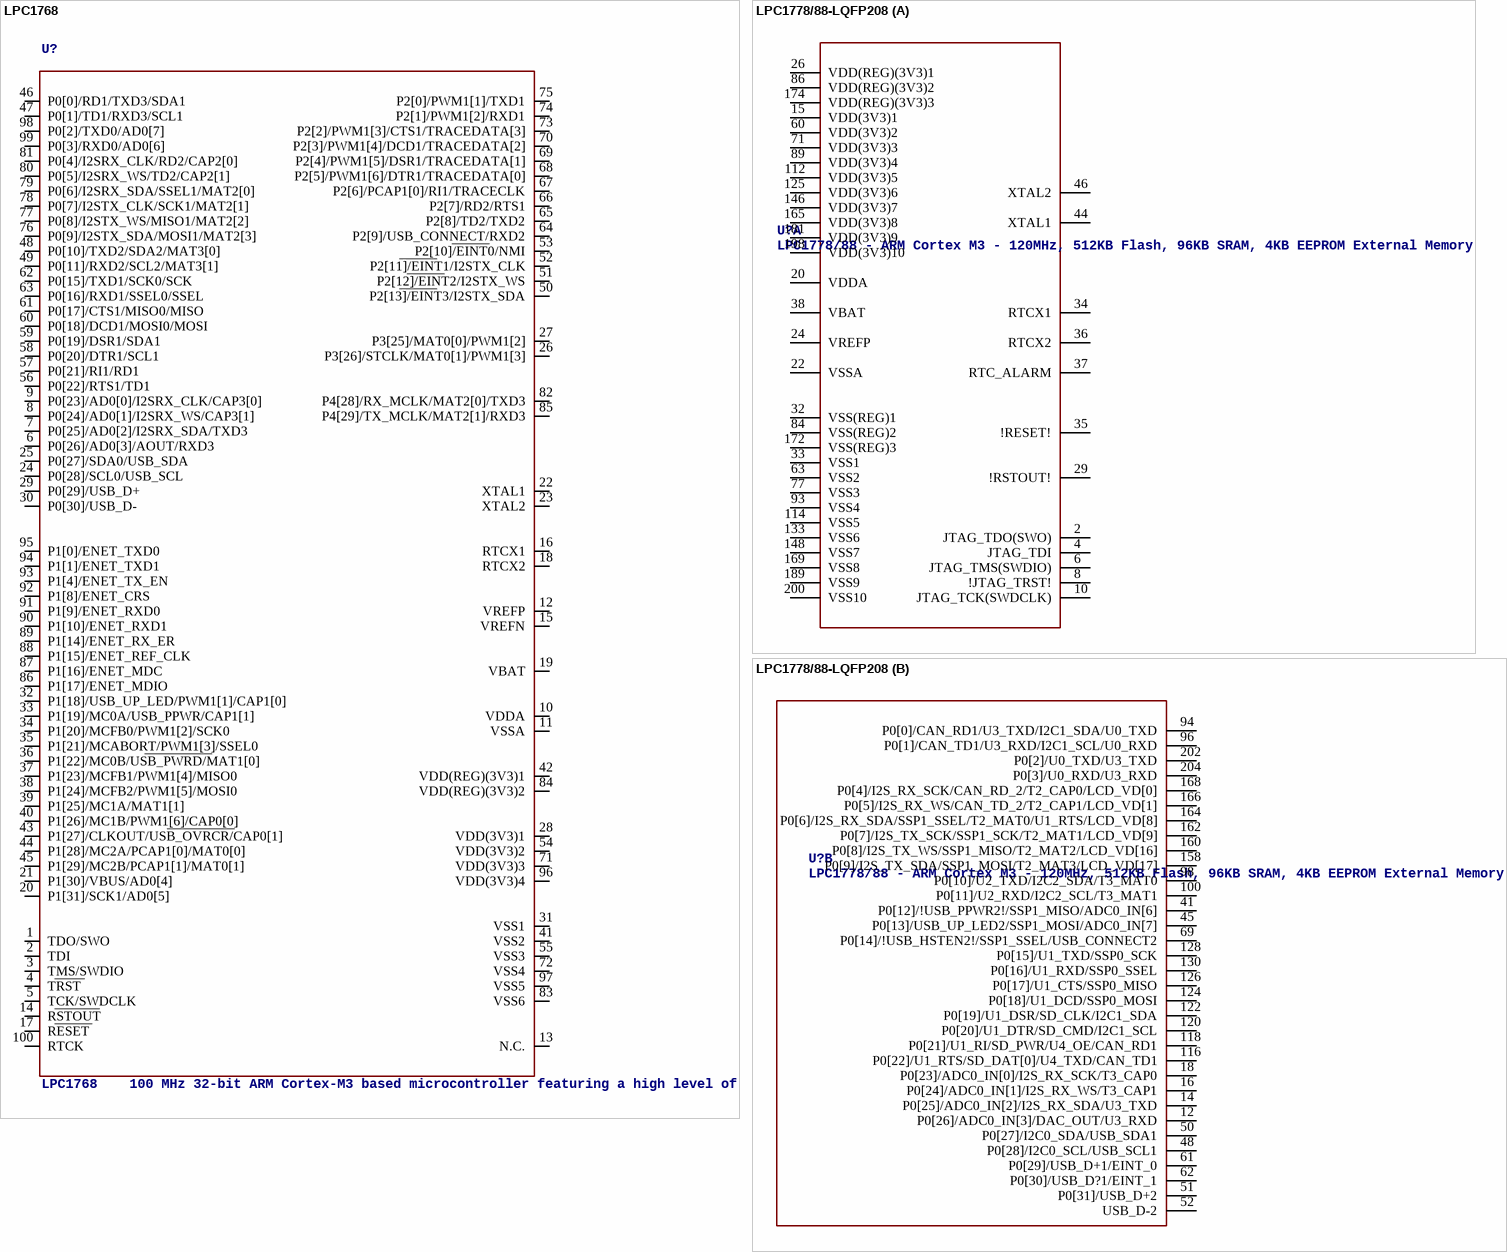
[diagram p33: symbols LPC1768 to LPC1778/88-LQFP208]
